# Altium footprint library Custom1.PcbLib: 554 footprints (part 30 of 35)
Each footprint in its own frame and in the unit in brackets; x right, y up, seen from the top. Pads: shape width x height; smd on the part's side, far side on the other; paste and mask are expansions set on the pad; w line width, h text height; cw(c..) or ccw(c..) is an arc to the next point about the centre after c.
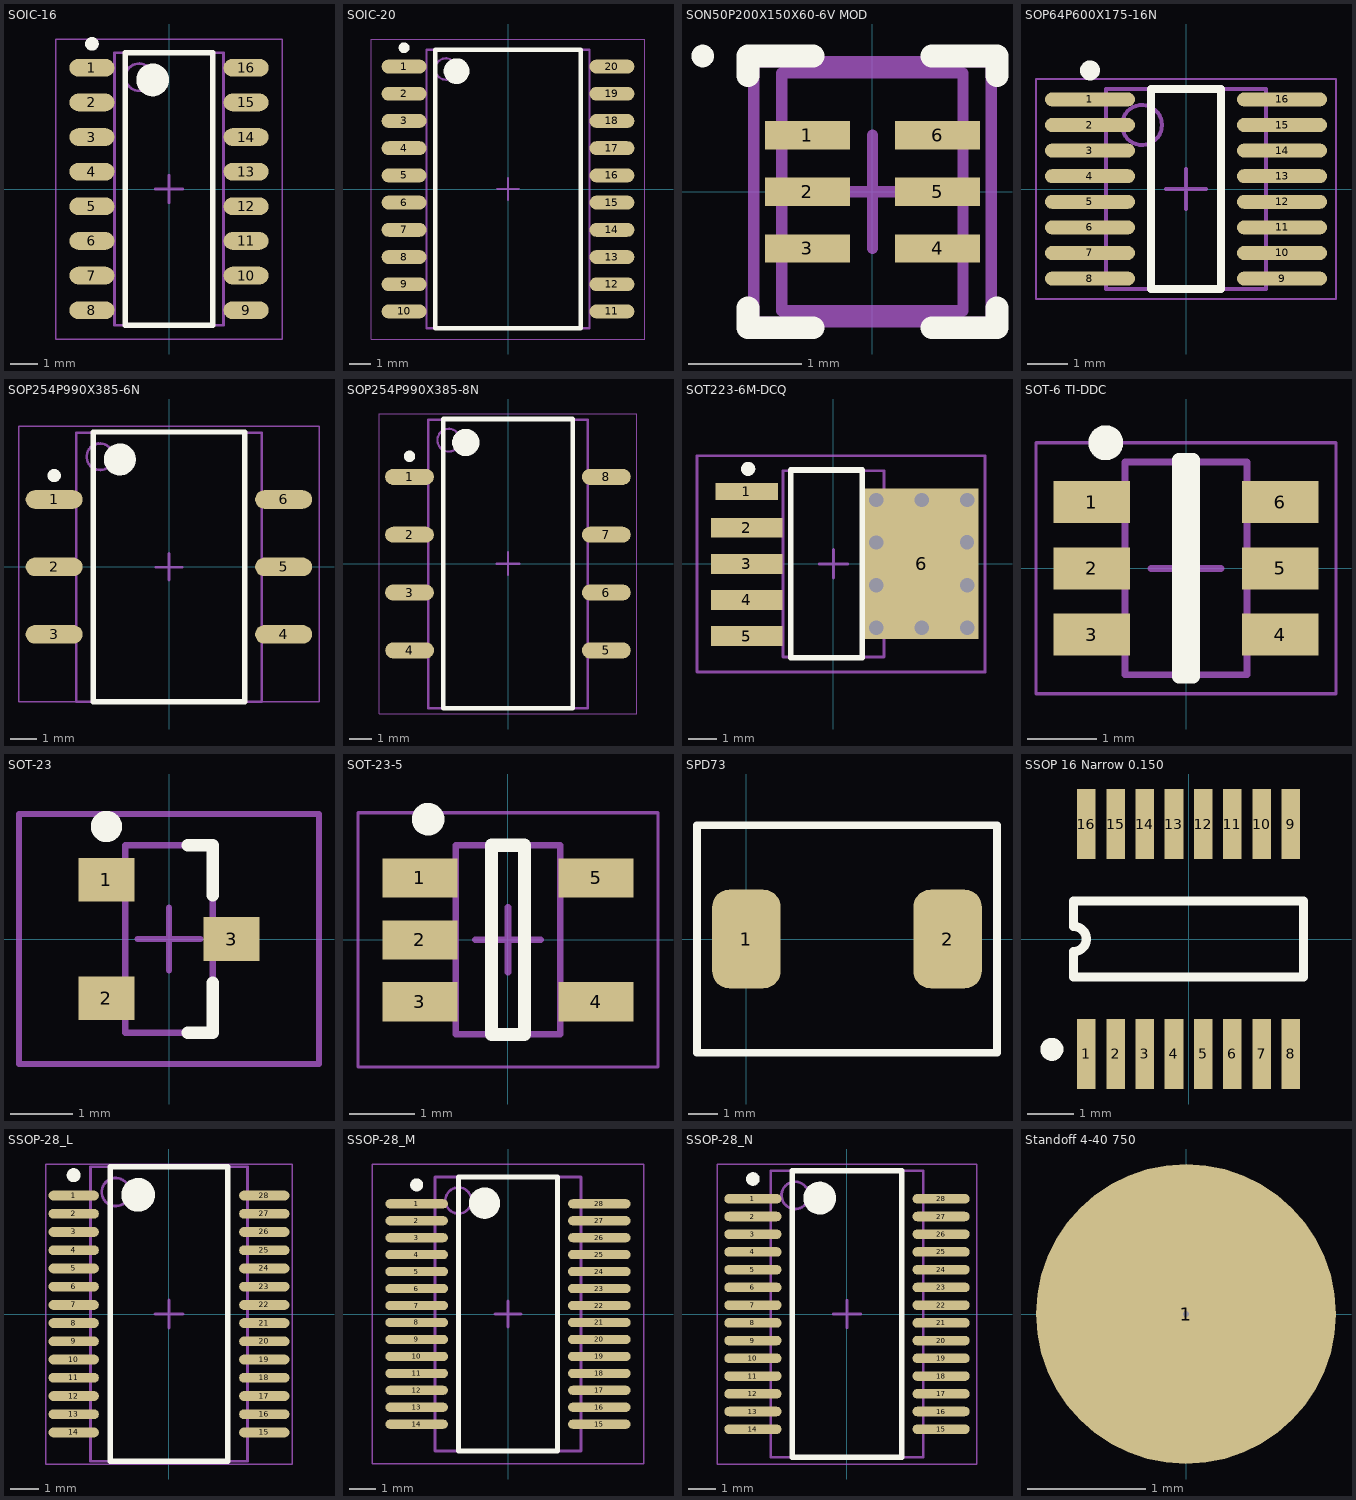
[diagram p29: the footprints below, top view; thin cyan lines are the x and y axes]

## SOIC-16 [mm] "SOIC, 16-Leads, Body 10x4mm, Pitch 1.27mm, IPC Low Density"
height 1.75
pads (16):
  oval 1.65x0.65 smd: 1(-2.825,4.445) 2(-2.825,3.175) 3(-2.825,1.905) 4(-2.825,0.635) 5(-2.825,-0.635) 6(-2.825,-1.905) 7(-2.825,-3.175) 8(-2.825,-4.445) 9(2.825,-4.445) 10(2.825,-3.175) 11(2.825,-1.905) 12(2.825,-0.635) 13(2.825,0.635) 14(2.825,1.905) 15(2.825,3.175) 16(2.825,4.445)
Top Overlay:
  circle w0.6: c-0.6,4 r0.3
  circle w0.25: c-2.825,5.32 r0.125
  lines w0.2: -1.6,-5 1.6,-5 1.6,5 -1.6,5 -1.6,-5
Mechanical 13:
  circle w0.1: c-1.1,4.1 r0.5
  lines w0.1: -2,-5 2,-5 2,5 -2,5 -2,-5
Mechanical 15:
  lines w0.05: -4.15,-5.5 4.15,-5.5 4.15,5.5 -4.15,5.5 -4.15,-5.5
  lines w0.1: -0.5,0 0.5,0 ; 0,-0.5 0,0.5
3D body "SOIC-16akaD0016AakaM16A.stp": height 1.75, standoff -0.01, extent -2.997,-4.953 2.997,4.953

## SOIC-20 [mm] "SOIC, 20-Leads, Body 13x7.6mm, Pitch 1.27mm, IPC Low Density"
height 2.65
pads (20):
  oval 2.1x0.65 smd: 1(-4.85,5.715) 2(-4.85,4.445) 3(-4.85,3.175) 4(-4.85,1.905) 5(-4.85,0.635) 6(-4.85,-0.635) 7(-4.85,-1.905) 8(-4.85,-3.175) 9(-4.85,-4.445) 10(-4.85,-5.715) 11(4.85,-5.715) 12(4.85,-4.445) 13(4.85,-3.175) 14(4.85,-1.905) 15(4.85,-0.635) 16(4.85,0.635) 17(4.85,1.905) 18(4.85,3.175) 19(4.85,4.445) 20(4.85,5.715)
Top Overlay:
  circle w0.25: c-4.85,6.59 r0.125
  circle w0.6: c-2.4,5.5 r0.3
  lines w0.2: -3.4,-6.5 -3.4,6.5 3.4,6.5 3.4,-6.5 -3.4,-6.5
Mechanical 13:
  circle w0.1: c-2.9,5.6 r0.5
  lines w0.1: -3.8,-6.5 -3.8,6.5 3.8,6.5 3.8,-6.5 -3.8,-6.5
Mechanical 15:
  lines w0.05: -6.375,-7 -6.375,7 6.375,7 6.375,-7 -6.375,-7
  lines w0.1: -0.5,0 0.5,0 ; 0,-0.5 0,0.5
3D body "DW0028A.stp": height 2.65, standoff -0.02, extent -5.162,-6.401 5.163,6.401

## SON50P200X150X60-6V MOD [mm] "SON, 6-Leads, Body 2x1.5mm, Pitch 0.5mm, NSC Recommended"
height 0.6
pads (6):
  rect 0.75x0.25 smd paste-0.125 mask+0.051: 1(-0.575,0.5) 2(-0.575,0) 3(-0.575,-0.5) 4(0.575,-0.5) 5(0.575,0) 6(0.575,0.5)
Top Overlay:
  circle w0.1: c-1.5,1.2 r0.05
  lines w0.2: -1.1,-1.025 -1.1,-1.2 -0.525,-1.2 ; -1.1,1.025 -1.1,1.2 -0.525,1.2 ; 0.525,-1.2 1.1,-1.2 1.1,-1.025 ; 0.525,1.2 1.1,1.2 1.1,1.025
Top Paste:
  rectangle: -1.15,0.375 -0.3,0.625
  rectangle: -1.15,-0.125 -0.3,0.125
  rectangle: -1.15,-0.625 -0.3,-0.375
  region: 1.1,-0.375 0.25,-0.375 0.25,-0.625 1.1,-0.625
  region: 1.1,0.125 0.25,0.125 0.25,-0.125 1.1,-0.125
  region: 1.1,0.625 0.25,0.625 0.25,0.375 1.1,0.375
Mechanical 13:
  lines w0.1: -0.8,-1.05 0.8,-1.05 0.8,1.05 -0.8,1.05 -0.8,-1.05
Mechanical 15:
  lines w0.1: -0.5,0 0.5,0 ; 0,-0.5 0,0.5 ; -1.05,-1.15 1.05,-1.15 1.05,1.15 -1.05,1.15 -1.05,-1.15
3D body: height 0.6, standoff 0, extent -0.799,-1.049 0.799,1.049

## SOP64P600X175-16N [mm] "SOP, 16-Leads, Body 4.90x3.91mm, Pitch 0.64mm, IPC Medium Density"
height 1.75
pads (16):
  oval 2.25x0.35 smd: 1(-2.4,2.24) 2(-2.4,1.6) 3(-2.4,0.96) 4(-2.4,0.32) 5(-2.4,-0.32) 6(-2.4,-0.96) 7(-2.4,-1.6) 8(-2.4,-2.24) 9(2.4,-2.24) 10(2.4,-1.6) 11(2.4,-0.96) 12(2.4,-0.32) 13(2.4,0.32) 14(2.4,0.96) 15(2.4,1.6) 16(2.4,2.24)
Top Overlay:
  circle w0.25: c-2.4,2.965 r0.125
  lines w0.2: -0.875,-2.5 -0.875,2.5 0.875,2.5 0.875,-2.5 -0.875,-2.5
Mechanical 13:
  circle w0.1: c-1.1,1.6 r0.5
  lines w0.1: -2,-2.5 -2,2.5 2,2.5 2,-2.5 -2,-2.5
Mechanical 15:
  lines w0.05: -3.75,-2.75 -3.75,2.75 3.75,2.75 3.75,-2.75 -3.75,-2.75
  lines w0.1: -0.5,0 0.5,0 ; 0,-0.5 0,0.5
3D body: height 1.75, standoff 0.1, extent -2,-2.5 2,2.5

## SOP254P990X385-6N [mm] "SOP, 6-Leads, Body 9.60x6.73mm, Pitch 2.54mm, IPC Medium Density"
height 3.85
pads (6):
  oval 2.15x0.7 smd: 1(-4.325,2.54) 2(-4.325,0) 3(-4.325,-2.54) 4(4.318,-2.54) 5(4.318,0) 6(4.318,2.54)
Top Overlay:
  circle w0.25: c-4.325,3.44 r0.125
  circle w0.6: c-1.85,4.05 r0.3
  lines w0.2: -2.85,-5.08 -2.85,5.08 2.85,5.08 2.85,-5.08 -2.85,-5.08
Mechanical 13:
  circle w0.1: c-2.6,4.15 r0.5
  lines w0.1: -3.5,-5.08 -3.5,5.05 3.5,5.05 3.5,-5.08 -3.5,-5.08
Mechanical 15:
  lines w0.05: -5.65,-5.08 -5.65,5.3 5.65,5.3 5.65,-5.08 -5.65,-5.08
  lines w0.1: -0.5,-0.008 0.5,-0.008 ; 0,-0.492 0,0.508
3D body: height 3.85, standoff 0.25, extent -3.5,-5.08 3.5,5.05

## SOP254P990X385-8N [mm] "SOP, 6-Leads, Body 9.60x6.73mm, Pitch 2.54mm, IPC Medium Density"
height 3.85
pads (8):
  oval 2.15x0.7 smd: 1(-4.325,3.81) 2(-4.325,1.27) 3(-4.325,-1.27) 4(-4.318,-3.81) 5(4.318,-3.81) 6(4.318,-1.27) 7(4.318,1.27) 8(4.318,3.81)
Top Overlay:
  circle w0.25: c-4.325,4.71 r0.125
  circle w0.6: c-1.85,5.32 r0.3
  lines w0.2: -2.85,-6.35 -2.85,6.35 2.85,6.35 2.85,-6.35 -2.85,-6.35
Mechanical 13:
  circle w0.1: c-2.6,5.42 r0.5
  lines w0.1: -3.5,-6.35 -3.5,6.32 3.5,6.32 3.5,-6.35 -3.5,-6.35
Mechanical 15:
  lines w0.05: -5.65,-6.604 -5.65,6.57 5.65,6.57 5.65,-6.604 -5.65,-6.604
  lines w0.1: -0.5,0 0.5,0 ; 0,-0.492 0,0.508
3D body: height 3.85, standoff 0.25, extent -3.5,-6.35 3.5,6.32

## SOT223-6M-DCQ [mm] "SOT223, 6-Leads, Body 6.5x3.5mm, Pitch 1.27mm, Lead Span 7mm, IPC Low Density"
height 1.8
pads (6):
  rect 2.2x0.6 smd: 1(-3.05,2.54)
  rect 2.5x0.7 smd: 2(-3.05,1.27) 3(-3.05,0) 4(-3.05,-1.27) 5(-3.05,-2.54)
  rect 4x5.3 smd paste-0.9 mask-0.9: 6(3.1,0)
via 4.699,0.762 diameter 0.6 hole 0.5
via 1.5,0.75 diameter 0.6 hole 0.5
via 1.5,-2.25 diameter 0.6 hole 0.5
via 4.7,-2.25 diameter 0.6 hole 0.5
via 3.1,2.25 diameter 0.6 hole 0.5
via 1.5,2.25 diameter 0.6 hole 0.5
via 1.5,-0.75 diameter 0.6 hole 0.5
via 4.7,-0.75 diameter 0.6 hole 0.5
via 3.1,-2.25 diameter 0.6 hole 0.5
via 4.7,2.25 diameter 0.6 hole 0.5
Top Overlay:
  circle w0.25: c-3,3.34 r0.125
  lines w0.2: -1.5,-3.3 1.016,-3.3 1.016,3.3 -1.5,3.3 -1.5,-3.3
Mechanical 13:
  lines w0.1: -1.775,-3.275 1.775,-3.275 1.775,3.275 -1.775,3.275 -1.775,-3.275
Mechanical 15:
  lines w0.1: -0.5,0 0.5,0 ; 0,-0.5 0,0.5 ; 5.334,-3.81 5.334,3.79 ; 5.334,-3.8 -4.8,-3.8 -4.8,3.8 5.334,3.8
3D body: height 1.8, standoff 0.02, extent -1.774,-3.274 1.774,3.274

## SOT-6 TI-DDC [mm] "SOT-23, 6-Leads, Body 2.90x1.60mm, Pitch 0.95mm"
height 1.1
pads (6):
  rect 1.1x0.6 smd: 1(-1.35,0.95) 2(-1.35,0) 3(-1.35,-0.95) 4(1.35,-0.95) 5(1.35,0) 6(1.35,0.95)
Top Overlay:
  circle w0.25: c-1.15,1.8 r0.125
  lines w0.2: -0.1,-1.55 -0.1,1.55 0.1,1.55 0.1,-1.55 -0.1,-1.55
Mechanical 13:
  lines w0.1: -0.875,-1.525 0.875,-1.525 0.875,1.525 -0.875,1.525 -0.875,-1.525
Mechanical 15:
  lines w0.05: -2.15,-1.8 2.15,-1.8 2.15,1.8 -2.15,1.8 -2.15,-1.8
  lines w0.1: -0.5,0 0.5,0 ; 0,-0.5 0,0.5
3D body: height 1.45, standoff 0, extent -0.875,-1.525 0.875,1.525

## SOT-23 [mm] "SOT23, 3-Leads, Body 2.9x1.3mm, Pitch 0.95mm, 0.7 x 0.9"
height 1.143
pads (3):
  rect 0.9x0.7 smd: 1(-1,0.95) 2(-1,-0.95) 3(1,0)
Top Overlay:
  circle w0.25: c-1,1.8 r0.125
  lines w0.2: 0.3,-1.5 0.7,-1.5 0.7,-0.7 ; 0.3,1.5 0.7,1.5 0.7,0.7
Mechanical 13:
  lines w0.1: -0.7,-1.5 0.7,-1.5 0.7,1.5 -0.7,1.5 -0.7,-1.5
Mechanical 15:
  lines w0.1: -0.5,0 0.5,0 ; 0,-0.5 0,0.5 ; -2.4,-2 2.4,-2 2.4,2 -2.4,2 -2.4,-2
3D body: height 1.1, standoff 0, extent -0.7,-1.5 0.7,1.5

## SOT-23-5 [mm] "SOT23, 5-Leads, Body 2.9x1.6mm, Pitch 0.95mm, IPC Low Density"
height 1
pads (5):
  rect 1.15x0.6 smd: 1(-1.35,0.95) 2(-1.35,0) 3(-1.35,-0.95) 4(1.35,-0.95) 5(1.35,0.95)
Top Overlay:
  circle w0.25: c-1.225,1.85 r0.125
  lines w0.2: -0.25,-1.45 -0.25,1.45 0.25,1.45 0.25,-1.45 -0.25,-1.45
Mechanical 13:
  lines w0.1: -0.8,-1.45 0.8,-1.45 0.8,1.45 -0.8,1.45 -0.8,-1.45
Mechanical 15:
  lines w0.05: -2.3,-1.95 2.3,-1.95 2.3,1.95 -2.3,1.95 -2.3,-1.95
  lines w0.1: -0.5,0 0.5,0 ; 0,-0.5 0,0.5
3D body: height 1, standoff 0, extent -0.8,-1.45 0.8,1.45

## SPD73 [mil]
pads (2):
  rrect50% 90x130 smd: 1(0,0) 2(265,0)
Top Overlay:
  lines w10: -65,-150 330,-150 330,150 -65,150 -65,-150

## SSOP 16 Narrow 0.150 [mil] "SSOP; 16 Leads; Body Width 3.9 mm; Pitch 0.635 mm"
height 68.11
pads (16):
  rect 16x60 smd paste-2 mask+3: 1(-87.5,-98.43) 2(-62.5,-98.43) 3(-37.5,-98.43) 4(-12.5,-98.43) 5(12.5,-98.43) 6(37.5,-98.43) 7(62.5,-98.43) 8(87.5,-98.43) 9(87.5,98.43) 10(62.5,98.43) 11(37.5,98.43) 12(12.5,98.43) 13(-12.5,98.43) 14(-37.5,98.43) 15(-62.5,98.43) 16(-87.5,98.43)
Top Overlay:
  circle w9.84: c-117.03,-94.49 r4.92
  lines w7.87: -98.42,-32.48 -98.42,-10.83 ccw(c-98.42,0) -98.42,10.83 -98.42,32.48 98.42,32.48 98.42,-32.48 -98.42,-32.48

## SSOP-28_L [mm] "SOP, 28-Leads, Body 10.2x5.3mm, Pitch 0.65mm, IPC High Density"
height 2
pads (28):
  oval 1.8x0.35 smd: 1(-3.4,4.225) 2(-3.4,3.575) 3(-3.4,2.925) 4(-3.4,2.275) 5(-3.4,1.625) 6(-3.4,0.975) 7(-3.4,0.325) 8(-3.4,-0.325) 9(-3.4,-0.975) 10(-3.4,-1.625) 11(-3.4,-2.275) 12(-3.4,-2.925) 13(-3.4,-3.575) 14(-3.4,-4.225) 15(3.4,-4.225) 16(3.4,-3.575) 17(3.4,-2.925) 18(3.4,-2.275) 19(3.4,-1.625) 20(3.4,-0.975) 21(3.4,-0.325) 22(3.4,0.325) 23(3.4,0.975) 24(3.4,1.625) 25(3.4,2.275) 26(3.4,2.925) 27(3.4,3.575) 28(3.4,4.225)
Top Overlay:
  circle w0.6: c-1.1,4.25 r0.3
  circle w0.25: c-3.4,4.95 r0.125
  lines w0.2: -2.1,-5.25 2.1,-5.25 2.1,5.25 -2.1,5.25 -2.1,-5.25
Mechanical 13:
  circle w0.1: c-1.9,4.35 r0.5
  lines w0.1: -2.8,-5.25 2.8,-5.25 2.8,5.25 -2.8,5.25 -2.8,-5.25
Mechanical 15:
  lines w0.05: -4.4,-5.35 4.4,-5.35 4.4,5.35 -4.4,5.35 -4.4,-5.35
  lines w0.1: -0.5,0 0.5,0 ; 0,-0.5 0,0.5
3D body: height 2, standoff 0.05, extent -2.8,-5.25 2.8,5.25

## SSOP-28_M [mm] "SOP, 28-Leads, Body 10.2x5.3mm, Pitch 0.65mm, IPC Low Density"
height 2
pads (28):
  oval 2.4x0.35 smd: 1(-3.5,4.225) 2(-3.5,3.575) 3(-3.5,2.925) 4(-3.5,2.275) 5(-3.5,1.625) 6(-3.5,0.975) 7(-3.5,0.325) 8(-3.5,-0.325) 9(-3.5,-0.975) 10(-3.5,-1.625) 11(-3.5,-2.275) 12(-3.5,-2.925) 13(-3.5,-3.575) 14(-3.5,-4.225) 15(3.5,-4.225) 16(3.5,-3.575) 17(3.5,-2.925) 18(3.5,-2.275) 19(3.5,-1.625) 20(3.5,-0.975) 21(3.5,-0.325) 22(3.5,0.325) 23(3.5,0.975) 24(3.5,1.625) 25(3.5,2.275) 26(3.5,2.925) 27(3.5,3.575) 28(3.5,4.225)
Top Overlay:
  circle w0.6: c-0.9,4.25 r0.3
  circle w0.25: c-3.5,4.95 r0.125
  lines w0.2: -1.9,-5.25 1.9,-5.25 1.9,5.25 -1.9,5.25 -1.9,-5.25
Mechanical 13:
  circle w0.1: c-1.9,4.35 r0.5
  lines w0.1: -2.8,-5.25 2.8,-5.25 2.8,5.25 -2.8,5.25 -2.8,-5.25
Mechanical 15:
  lines w0.05: -5.2,-5.75 5.2,-5.75 5.2,5.75 -5.2,5.75 -5.2,-5.75
  lines w0.1: -0.5,0 0.5,0 ; 0,-0.5 0,0.5
3D body: height 2, standoff 0.05, extent -2.8,-5.25 2.8,5.25

## SSOP-28_N [mm] "SOP, 28-Leads, Body 10.2x5.3mm, Pitch 0.65mm, IPC Medium Density"
height 2
pads (28):
  oval 2.1x0.35 smd: 1(-3.45,4.225) 2(-3.45,3.575) 3(-3.45,2.925) 4(-3.45,2.275) 5(-3.45,1.625) 6(-3.45,0.975) 7(-3.45,0.325) 8(-3.45,-0.325) 9(-3.45,-0.975) 10(-3.45,-1.625) 11(-3.45,-2.275) 12(-3.45,-2.925) 13(-3.45,-3.575) 14(-3.45,-4.225) 15(3.45,-4.225) 16(3.45,-3.575) 17(3.45,-2.925) 18(3.45,-2.275) 19(3.45,-1.625) 20(3.45,-0.975) 21(3.45,-0.325) 22(3.45,0.325) 23(3.45,0.975) 24(3.45,1.625) 25(3.45,2.275) 26(3.45,2.925) 27(3.45,3.575) 28(3.45,4.225)
Top Overlay:
  circle w0.6: c-1,4.25 r0.3
  circle w0.25: c-3.45,4.95 r0.125
  lines w0.2: -2,-5.25 2,-5.25 2,5.25 -2,5.25 -2,-5.25
Mechanical 13:
  circle w0.1: c-1.9,4.35 r0.5
  lines w0.1: -2.8,-5.25 2.8,-5.25 2.8,5.25 -2.8,5.25 -2.8,-5.25
Mechanical 15:
  lines w0.05: -4.75,-5.5 4.75,-5.5 4.75,5.5 -4.75,5.5 -4.75,-5.5
  lines w0.1: -0.5,0 0.5,0 ; 0,-0.5 0,0.5
3D body: height 2, standoff 0.05, extent -2.8,-5.25 2.8,5.25

## Standoff 4-40 750 [mil]
pads (1):
  round 100 hole 2: 1(0,0)
3D body "91115A166.STEP": height 750.5, standoff 0.5, extent -124.99,-144.33 125.01,144.34